# Altium footprint library CHIP.PcbLib: 86 footprints (part 5 of 6)
Each footprint in its own frame and in the unit in brackets; x right, y up, seen from the top. Pads: shape width x height; smd on the part's side, far side on the other; paste and mask are expansions set on the pad; w line width, h text height; cw(c..) or ccw(c..) is an arc to the next point about the centre after c.
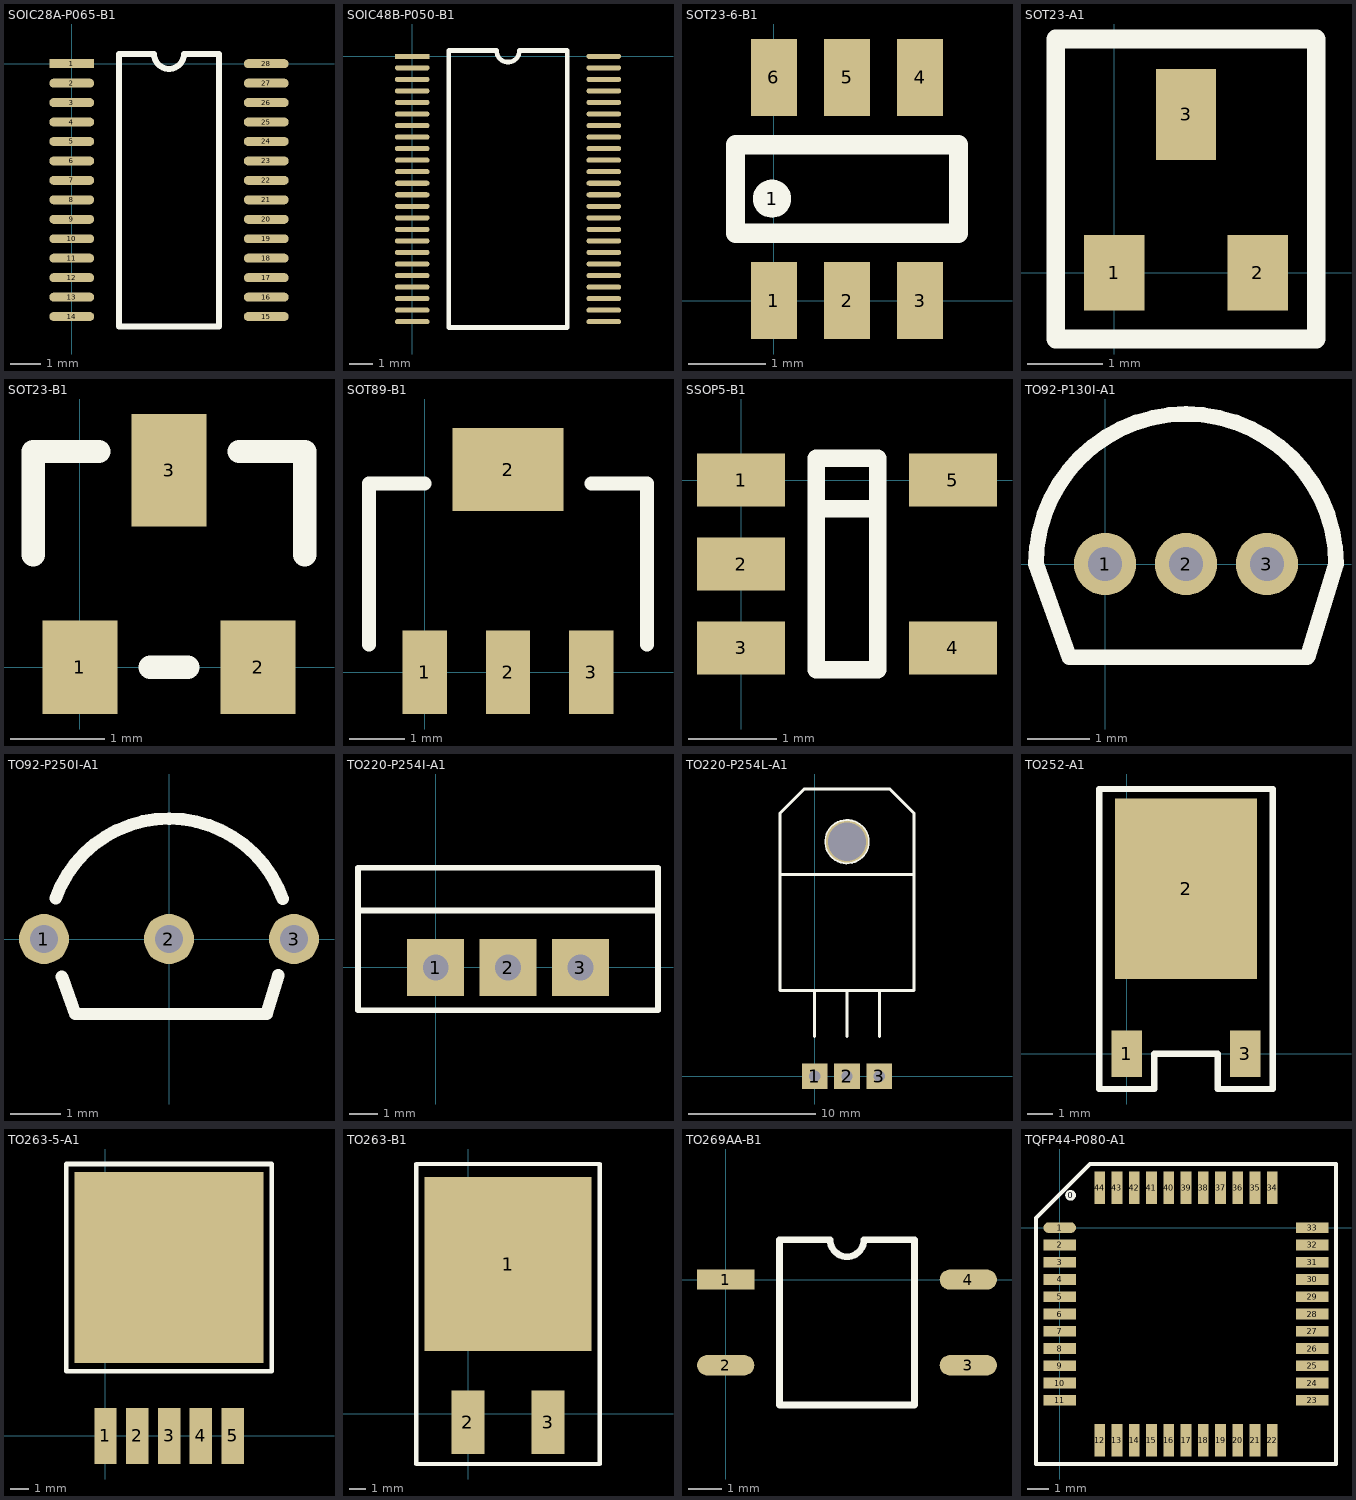
[diagram p4: the footprints below, top view; thin cyan lines are the x and y axes]

## SOIC28A-P065-B1 [mm]
pads (28):
  rect 1.5x0.3 smd: 1(0,0)
  oval 1.5x0.3 smd: 2(0,-0.65) 3(0,-1.3) 4(0,-1.95) 5(0,-2.6) 6(0,-3.25) 7(0,-3.9) 8(0,-4.55) 9(0,-5.2) 10(0,-5.85) 11(0,-6.5) 12(0,-7.15) 13(0,-7.8) 14(0,-8.45) 15(6.5,-8.45) 16(6.5,-7.8) 17(6.5,-7.15) 18(6.5,-6.5) 19(6.5,-5.85) 20(6.5,-5.2) 21(6.5,-4.55) 22(6.5,-3.9) 23(6.5,-3.25) 24(6.5,-2.6) 25(6.5,-1.95) 26(6.5,-1.3) 27(6.5,-0.65) 28(6.5,0)
Top Overlay:
  lines w0.2: 1.585,-8.775 1.585,0.325 2.75,0.325 ccw(c3.25,0.325) 3.75,0.325 4.915,0.325 4.915,-8.775 1.585,-8.775

## SOIC48B-P050-B1 [mm]
pads (48):
  rect 1.5x0.22 smd: 1(0,0)
  oval 1.5x0.22 smd: 2(0,-0.5) 3(0,-1) 4(0,-1.5) 5(0,-2) 6(0,-2.5) 7(0,-3) 8(0,-3.5) 9(0,-4) 10(0,-4.5) 11(0,-5) 12(0,-5.5) 13(0,-6) 14(0,-6.5) 15(0,-7) 16(0,-7.5) 17(0,-8) 18(0,-8.5) 19(0,-9) 20(0,-9.5) 21(0,-10) 22(0,-10.5) 23(0,-11) 24(0,-11.5) 25(8.3,-11.5) 26(8.3,-11) 27(8.3,-10.5) 28(8.3,-10) 29(8.3,-9.5) 30(8.3,-9) 31(8.3,-8.5) 32(8.3,-8) 33(8.3,-7.5) 34(8.3,-7) 35(8.3,-6.5) 36(8.3,-6) 37(8.3,-5.5) 38(8.3,-5) 39(8.3,-4.5) 40(8.3,-4) 41(8.3,-3.5) 42(8.3,-3) 43(8.3,-2.5) 44(8.3,-2) 45(8.3,-1.5) 46(8.3,-1) 47(8.3,-0.5) 48(8.3,0)
Top Overlay:
  lines w0.2: 1.585,-11.75 1.585,0.25 3.65,0.25 ccw(c4.15,0.25) 4.65,0.25 6.715,0.25 6.715,-11.75 1.585,-11.75

## SOT23-6-B1 [mm]
pads (7):
  round 0.5 on Top Overlay: 1(-0.025,1.325)
  rect 0.6x1 smd: 1(0,0) 2(0.95,0) 3(1.9,0) 4(1.9,2.9) 5(0.95,2.9) 6(0,2.9)
Top Overlay:
  lines w0.25: -0.5,0.875 -0.5,2.025 2.4,2.025 2.4,0.875 -0.5,0.875
3D body "User Library-SOT23-6-2.STEP": height 1.45, standoff 0, extent -0.51,0.06 2.39,2.86

## SOT23-A1 [mm]
pads (3):
  rect 0.8x1 smd: 1(0,0) 2(1.9,0)
  rect 0.8x1.2 smd: 3(0.95,2.1)
Top Overlay:
  lines w0.25: -0.775,-0.875 2.675,-0.875 2.675,3.1 -0.775,3.1 -0.775,-0.875
3D body "SOT-23.STEP": height 1.08, standoff 0, extent -0.547,-0.265 2.453,2.375

## SOT23-B1 [mm]
pads (3):
  rect 0.8x1 smd: 1(0,0) 2(1.9,0)
  rect 0.8x1.2 smd: 3(0.95,2.1)
Top Overlay:
  lines w0.25: -0.5,1.2 -0.5,2.3 0.2,2.3 ; 0.75,0 1.15,0 ; 1.7,2.3 2.4,2.3 2.4,1.2
3D body "SOT-23.STEP": height 1.08, standoff 0, extent -0.55,-0.22 2.45,2.42

## SOT89-B1 [mm]
height 1.5
pads (4):
  rect 0.8x1.5 smd: 1(0,0) 2(1.5,0) 3(3,0)
  rect 2x1.5 smd: 2(1.5,3.65)
Top Overlay:
  lines w0.25: -1,0.5 -1,3.4 0,3.4 ; 3,3.4 4,3.4 4,0.5
3D body "SOT-89-2.STEP": height 1.4, standoff 0, extent -0.75,-0.235 3.75,3.7

## SSOP5-B1 [mm]
pads (5):
  rect 1x0.6 smd: 1(0,0) 2(0,-0.95) 3(0,-1.9) 4(2.4,-1.9) 5(2.4,0)
Top Overlay:
  lines w0.2: 0.85,-0.325 1.55,-0.325 ; 0.85,-2.15 0.85,0.25 1.55,0.25 1.55,-2.15 0.85,-2.15
3D body "bu4945g-tr.stp": height 1.12, standoff 0, extent -0.179,-2.422 2.621,0.478

## TO92-P130I-A1 [mm]
pads (3):
  round 1 hole 0.55: 1(0,0) 2(1.3,0) 3(2.6,0)
Top Overlay:
  lines w0.25: 3.245,-1.5 -0.575,-1.5 -1.11,0 cw(c1.3,0) 3.71,0 3.25,-1.5
3D body "User Library-TO-92_Str.STEP": height 5.5, standoff -7.5, extent -1.316,-1.584 3.91,2.62

## TO92-P250I-A1 [mm]
pads (3):
  round 1 hole 0.55: 1(-2.5,0) 2(0,0) 3(2.5,0)
Top Overlay:
  lines w0.25: -2.268,0.815 cw(c0,0) 2.273,0.8 ; -2.141,-0.753 -1.875,-1.5 1.945,-1.5 ; 1.95,-1.5 2.189,-0.721
3D body "User Library-TO-92_Bent.STEP": height 10, standoff -3, extent -2.796,-1.596 2.784,2.608

## TO220-P254I-A1 [mm]
height 4.7
pads (3):
  rect 2x2 hole 0.9: 1(-0.004,-0.003) 2(2.536,-0.003) 3(5.076,-0.003)
Top Overlay:
  lines w0.2: -2.729,-1.503 -2.729,3.497 7.796,3.497 7.796,-1.503 ; -2.714,-1.503 2.536,-1.503 7.786,-1.503 ; -2.714,1.997 2.536,1.997 7.786,1.997
3D body "SW3DPS-TO-220HS-DEFAULT.STEP": height 18.54, standoff -3.81, extent -2.502,-1.444 7.658,3.128

## TO220-P254L-A1 [mm]
pads (4):
  rect 2x2 hole 0.9: 1(0,0) 2(2.54,0) 3(5.08,0)
  round 3.3 hole 3: ""(2.54,18.385)
Top Overlay:
  circle w0.25: c2.54,18.385 r1.65
  lines w0.25: -2.711,15.814 7.79,15.814 ; -2.711,20.615 -2.711,6.714 7.79,6.714 7.79,20.615 ; -0.001,3.114 -0.001,6.714 ; 2.539,3.114 2.539,6.714 ; 5.079,3.114 5.079,6.714
  lines w0.254: -2.711,20.615 -0.811,22.515 5.89,22.515 7.79,20.615
3D body "User Library-TO220-1.STEP": height 4.5, standoff -3.5, extent -2.681,-0.151 7.719,20.948

## TO252-A1 [mm]
height 2.3
pads (3):
  rect 1.2x1.8 smd: 1(0,0) 3(4.6,0)
  rect 5.5x7 smd: 2(2.3,6.4)
Top Overlay:
  lines w0.25: 1.075,-1.375 -1.075,-1.375 -1.075,10.27 5.675,10.27 5.675,-1.375 3.525,-1.375 ; 1.075,-1.325 1.075,0 3.525,0 3.525,-1.325
3D body "DPAK_TO-252AA.STEP": height 2.37, standoff -0.03, extent -1.147,-0.458 5.587,9.642

## TO263-5-A1 [mm]
height 4.7
pads (6):
  rect 1.2x3 smd: 1(0,0) 2(1.7,0) 3(3.4,0) 4(5.1,0) 5(6.8,0)
  rect 10.1x10.2 smd: ""(3.4,9)
Top Overlay:
  lines w0.254: -2.098,3.457 -2.098,14.54 8.891,14.54 8.891,3.457 -2.098,3.457
3D body "TO-263-5.STEP": height 4.56, standoff 0, extent -1.67,-0.767 8.49,13.247

## TO263-B1 [mm]
pads (3):
  rect 10x10.45 smd: 1(2.399,8.996)
  rect 2x3.8 smd: 2(-0.001,-0.5) 3(4.799,-0.5)
Top Overlay:
  lines w0.254: -3.101,-3.004 7.899,-3.004 7.899,14.996 -3.101,14.996 -3.101,-2.994
3D body "SW3dPS-DPAK.STEP": height 4.88, standoff -0.13, extent -2.726,-1.775 7.434,13.489

## TO269AA-B1 [mm]
pads (4):
  rect 1.7x0.6 smd: 1(0,0)
  oval 1.7x0.6 smd: 2(0,-2.54) 3(7.2,-2.54) 4(7.2,0)
Top Overlay:
  lines w0.2: 1.6,-3.72 1.6,1.18 3.1,1.18 ccw(c3.6,1.18) 4.1,1.18 5.6,1.18 5.6,-3.72 1.6,-3.72

## TQFP44-P080-A1 [mm]
pads (45):
  round 0.5 on Top Overlay: 0(0.5,1.5)
  oval 1.5x0.5 smd: 1(0,0)
  rect 1.5x0.5 smd: 2(0,-0.8) 3(0,-1.6) 4(0,-2.4) 5(0,-3.2) 6(0,-4) 7(0,-4.8) 8(0,-5.6) 9(0,-6.4) 10(0,-7.2) 11(0,-8) 23(11.7,-8) 24(11.7,-7.2) 25(11.7,-6.4) 26(11.7,-5.6) 27(11.7,-4.8) 28(11.7,-4) 29(11.7,-3.2) 30(11.7,-2.4) 31(11.7,-1.6) 32(11.7,-0.8) 33(11.7,0)
  rect 0.5x1.5 smd: 12(1.85,-9.85) 13(2.65,-9.85) 14(3.45,-9.85) 15(4.25,-9.85) 16(5.05,-9.85) 17(5.85,-9.85) 18(6.65,-9.85) 19(7.45,-9.85) 20(8.25,-9.85) 21(9.05,-9.85) 22(9.85,-9.85) 34(9.85,1.85) 35(9.05,1.85) 36(8.25,1.85) 37(7.45,1.85) 38(6.65,1.85) 39(5.85,1.85) 40(5.05,1.85) 41(4.25,1.85) 42(3.45,1.85) 43(2.65,1.85) 44(1.85,1.85)
Top Overlay:
  lines w0.2: -1.1,-10.95 12.8,-10.95 12.8,2.95 1.4,2.95 -1.1,0.45 -1.1,-10.95
3D body "User Library-TQFP44.STEP": height 1.13, standoff 0.06, extent -0.159,-9.99 11.841,2.01